# Altium footprint library F10wers_Footprints.PcbLib: 25 footprints (part 1 of 2)
Each footprint in its own frame and in the unit in brackets; x right, y up, seen from the top. Pads: shape width x height; smd on the part's side, far side on the other; paste and mask are expansions set on the pad; w line width, h text height; cw(c..) or ccw(c..) is an arc to the next point about the centre after c.
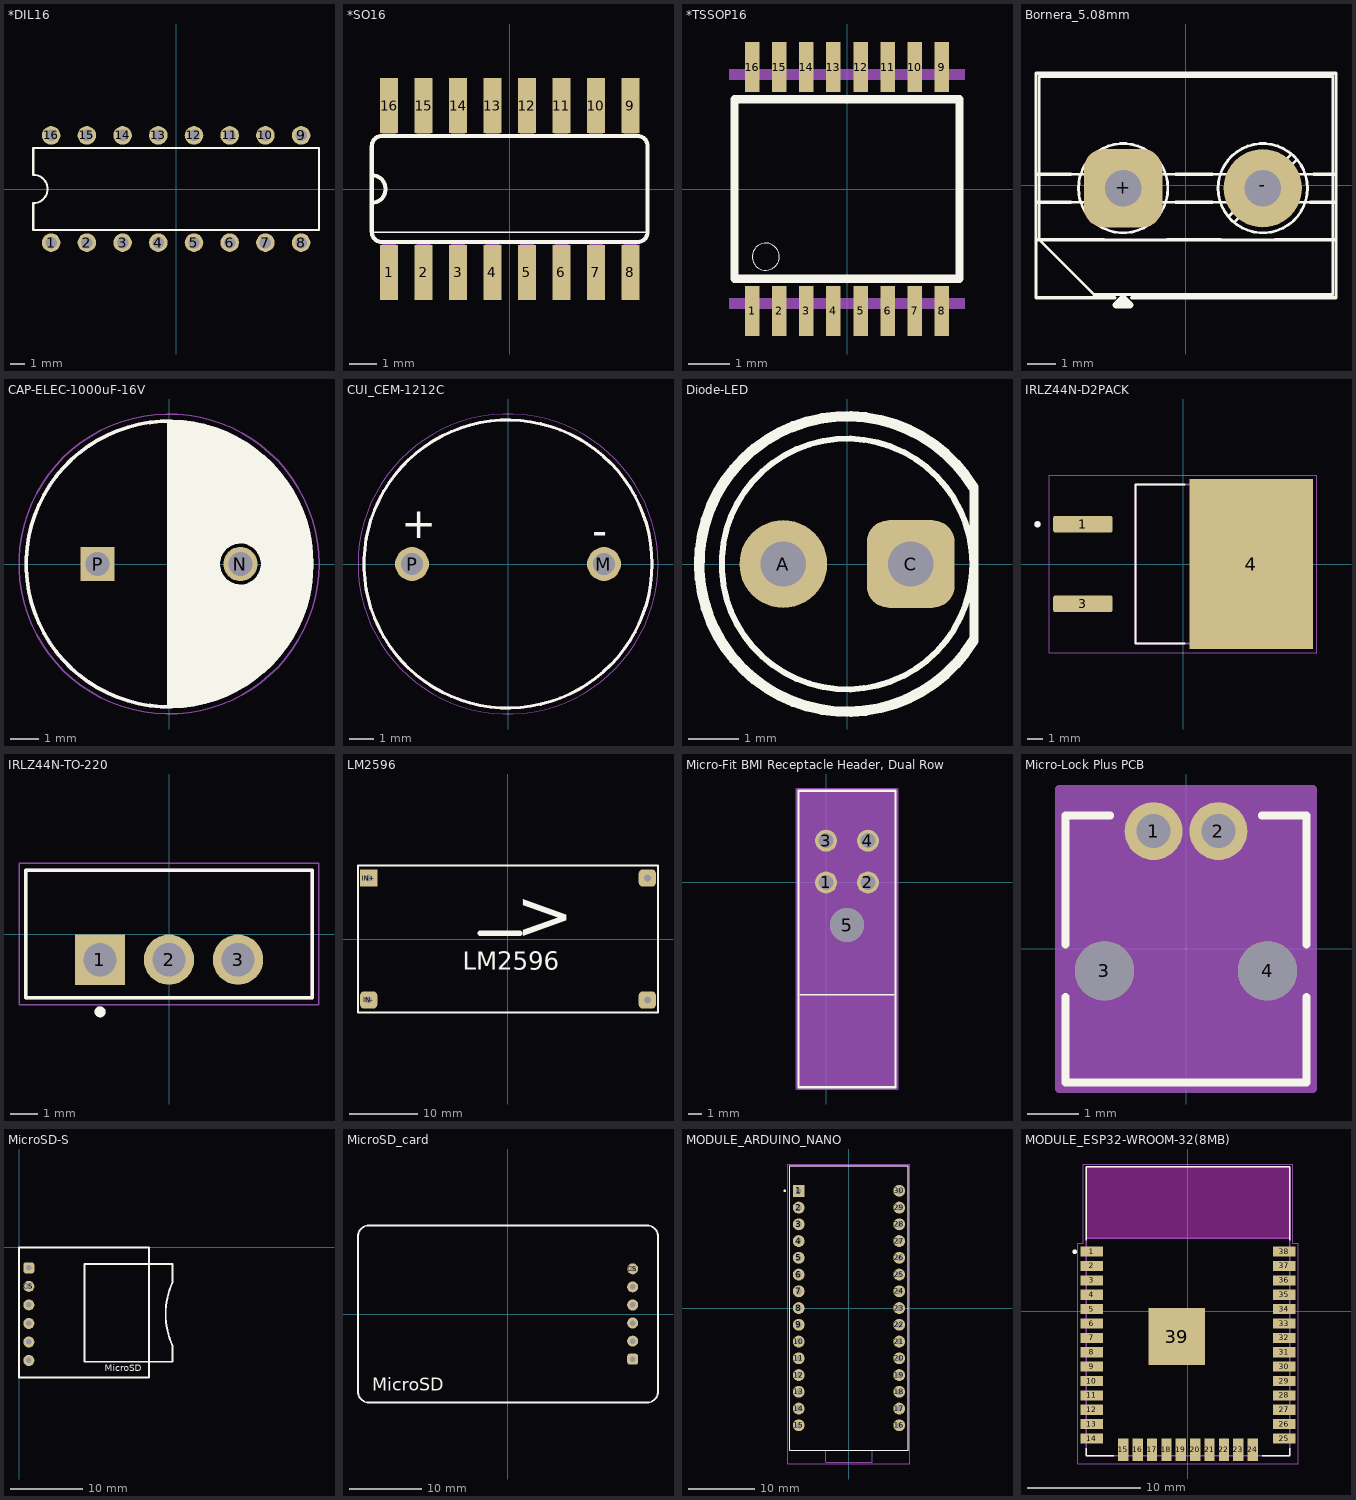
[diagram p0: the footprints below, top view; thin cyan lines are the x and y axes]

## *DIL16 [mil]
pads (16):
  round 52 hole 32: 1(-350,-150) 2(-250,-150) 3(-150,-150) 4(-50,-150) 5(50,-150) 6(150,-150) 7(250,-150) 8(350,-150) 9(350,150) 10(250,150) 11(150,150) 12(50,150) 13(-50,150) 14(-150,150) 15(-250,150) 16(-350,150)
Top Overlay:
  lines w6: -400,-115 -400,-40 ccw(c-400,0) -400,40 -400,115 400,115 400,-115 -400,-115
3D body "ULN2003A--3DModel-STEP-269445.STEP": height 209.84, standoff -154.76, extent -377.56,-164.76 377.56,154.92

## *SO16 [mil]
pads (16):
  rect 26x80 smd: 1(-175,-121) 2(-125,-121) 3(-75,-121) 4(-25,-121) 5(25,-121) 6(75,-121) 7(125,-121) 8(175,-121) 9(175,121) 10(125,121) 11(75,121) 12(25,121) 13(-25,121) 14(-75,121) 15(-125,121) 16(-175,121)
Top Overlay:
  lines w2: -200,-63 200,-63
  lines w6: -200,-20 ccw(c-200,0) -200,20 ; -200,-20 -200,-62 ccw(c-185,-62) -185,-77 185,-77 ccw(c185,-62) 200,-62 200,62 ccw(c185,62) 185,77 -185,77 ccw(c-185,62) -200,62 -200,20 ; -200,-20 -200,20
Mechanical 4:
  region: 165,122 185,122 185,77 165,77
  region: 115,122 135,122 135,77 115,77
  region: 65,122 85,122 85,77 65,77
  region: 15,122 35,122 35,77 15,77
  region: 165,-77 185,-77 185,-122 165,-122
  region: 115,-77 135,-77 135,-122 115,-122
  region: 65,-77 85,-77 85,-122 65,-122
  region: 15,-77 35,-77 35,-122 15,-122
  region: -185,122 -165,122 -165,77 -185,77
  region: -135,122 -115,122 -115,77 -135,77
  region: -85,122 -65,122 -65,77 -85,77
  region: -35,-77 -15,-77 -15,-122 -35,-122
  region: -85,-76 -65,-76 -65,-121 -85,-121
  region: -135,-77 -115,-77 -115,-122 -135,-122
  region: -185,-77 -165,-77 -165,-122 -185,-122
  region: -35,122 -15,122 -15,77 -35,77
  region: 165,122 185,122 185,77 165,77
  region: 115,122 135,122 135,77 115,77
  region: 65,122 85,122 85,77 65,77
  region: 15,122 35,122 35,77 15,77
  region: 165,-77 185,-77 185,-122 165,-122
  region: 115,-77 135,-77 135,-122 115,-122
  region: 65,-77 85,-77 85,-122 65,-122
  region: 15,-77 35,-77 35,-122 15,-122
  region: -185,122 -165,122 -165,77 -185,77
  region: -135,122 -115,122 -115,77 -135,77
  region: -85,122 -65,122 -65,77 -85,77
  region: -35,-77 -15,-77 -15,-122 -35,-122
  region: -85,-76 -65,-76 -65,-121 -85,-121
  region: -135,-77 -115,-77 -115,-122 -135,-122
  region: -185,-77 -165,-77 -165,-122 -185,-122
  region: -35,122 -15,122 -15,77 -35,77

## *TSSOP16 [mm]
pads (16):
  rect 0.35x1.2 smd: 1(-2.275,-2.925) 2(-1.625,-2.925) 3(-0.975,-2.925) 4(-0.325,-2.925) 5(0.325,-2.925) 6(0.975,-2.925) 7(1.625,-2.925) 8(2.275,-2.925) 9(2.275,2.925) 10(1.625,2.925) 11(0.975,2.925) 12(0.325,2.925) 13(-0.325,2.925) 14(-0.975,2.925) 15(-1.625,2.925) 16(-2.275,2.925)
Top Overlay:
  circle w0: c-1.95,-1.625 r0.325
  lines w0.203: -2.7,-2.15 -2.7,2.15 2.7,2.15 2.7,-2.15 -2.7,-2.15
Top Solder:
  region: -2.5,-2.25 -2.05,-2.25 -2.05,-3.6 -2.5,-3.6
  region: -1.85,-2.25 -1.4,-2.25 -1.4,-3.6 -1.85,-3.6
  region: -1.2,-2.25 -0.75,-2.25 -0.75,-3.6 -1.2,-3.6
  region: -0.55,-2.25 -0.1,-2.25 -0.1,-3.6 -0.55,-3.6
  region: 0.1,-2.25 0.55,-2.25 0.55,-3.6 0.1,-3.6
  region: 0.75,-2.25 1.2,-2.25 1.2,-3.6 0.75,-3.6
  region: 1.4,-2.25 1.85,-2.25 1.85,-3.6 1.4,-3.6
  region: 2.05,-2.25 2.5,-2.25 2.5,-3.6 2.05,-3.6
  region: 2.05,3.6 2.5,3.6 2.5,2.25 2.05,2.25
  region: 1.4,3.6 1.85,3.6 1.85,2.25 1.4,2.25
  region: 0.75,3.6 1.2,3.6 1.2,2.25 0.75,2.25
  region: 0.1,3.6 0.55,3.6 0.55,2.25 0.1,2.25
  region: -0.55,3.6 -0.1,3.6 -0.1,2.25 -0.55,2.25
  region: -1.2,3.6 -0.75,3.6 -0.75,2.25 -1.2,2.25
  region: -1.85,3.6 -1.4,3.6 -1.4,2.25 -1.85,2.25
  region: -2.5,3.6 -2.05,3.6 -2.05,2.25 -2.5,2.25
Mechanical 4:
  region: -2.825,-2.625 -1.725,-2.625 -1.725,-2.875 -2.825,-2.875
  region: -2.175,-2.625 -1.075,-2.625 -1.075,-2.875 -2.175,-2.875
  region: -1.525,-2.625 -0.425,-2.625 -0.425,-2.875 -1.525,-2.875
  region: -0.875,-2.625 0.225,-2.625 0.225,-2.875 -0.875,-2.875
  region: -0.225,-2.625 0.875,-2.625 0.875,-2.875 -0.225,-2.875
  region: 0.425,-2.625 1.525,-2.625 1.525,-2.875 0.425,-2.875
  region: 1.075,-2.625 2.175,-2.625 2.175,-2.875 1.075,-2.875
  region: 1.725,-2.625 2.825,-2.625 2.825,-2.875 1.725,-2.875
  region: 1.725,2.875 2.825,2.875 2.825,2.625 1.725,2.625
  region: 1.075,2.875 2.175,2.875 2.175,2.625 1.075,2.625
  region: 0.425,2.875 1.525,2.875 1.525,2.625 0.425,2.625
  region: -0.225,2.875 0.875,2.875 0.875,2.625 -0.225,2.625
  region: -0.875,2.875 0.225,2.875 0.225,2.625 -0.875,2.625
  region: -1.525,2.875 -0.425,2.875 -0.425,2.625 -1.525,2.625
  region: -2.175,2.875 -1.075,2.875 -1.075,2.625 -2.175,2.625
  region: -2.825,2.875 -1.725,2.875 -1.725,2.625 -2.825,2.625
  region: -2.825,-2.625 -1.725,-2.625 -1.725,-2.875 -2.825,-2.875
  region: -2.175,-2.625 -1.075,-2.625 -1.075,-2.875 -2.175,-2.875
  region: -1.525,-2.625 -0.425,-2.625 -0.425,-2.875 -1.525,-2.875
  region: -0.875,-2.625 0.225,-2.625 0.225,-2.875 -0.875,-2.875
  region: -0.225,-2.625 0.875,-2.625 0.875,-2.875 -0.225,-2.875
  region: 0.425,-2.625 1.525,-2.625 1.525,-2.875 0.425,-2.875
  region: 1.075,-2.625 2.175,-2.625 2.175,-2.875 1.075,-2.875
  region: 1.725,-2.625 2.825,-2.625 2.825,-2.875 1.725,-2.875
  region: 1.725,2.875 2.825,2.875 2.825,2.625 1.725,2.625
  region: 1.075,2.875 2.175,2.875 2.175,2.625 1.075,2.625
  region: 0.425,2.875 1.525,2.875 1.525,2.625 0.425,2.625
  region: -0.225,2.875 0.875,2.875 0.875,2.625 -0.225,2.625
  region: -0.875,2.875 0.225,2.875 0.225,2.625 -0.875,2.625
  region: -1.525,2.875 -0.425,2.875 -0.425,2.625 -1.525,2.625
  region: -2.175,2.875 -1.075,2.875 -1.075,2.625 -2.175,2.625
  region: -2.825,2.875 -1.725,2.875 -1.725,2.625 -2.825,2.625

## Bornera_5.08mm [mm]
pads (2):
  rrect50% 2.8x2.8 hole 1.3: +(-2.246,-0.1)
  round 2.8 hole 1.3: -(2.754,-0.1)
Top Overlay:
  circle w0.1: c-2.246,-0.1 r1.6
  circle w0.1: c2.754,-0.1 r1.6
  lines w0.1: -5.246,0.4 5.254,0.4 ; -5.221,-0.6 5.229,-0.6 ; -3.471,-1.125 -1.228,1.118 -1.228,1.113 ; -3.271,-1.325 -1.033,0.918 ; 1.536,-1.113 3.779,1.13 ; 1.736,-1.313 3.974,0.93 ; 5.229,-1.95 -5.246,-1.95 ; -5.246,-1.95 -3.296,-3.9 5.254,-3.9 5.254,3.9 -5.246,3.9 -5.246,-1.95 ; -5.246,-1.95 -5.246,-1.95
  lines w0.12: -5.366,-1.95 -2.946,-1.95 ; -5.366,-0.6 -4.126,-0.6 ; -5.366,0.4 -4.126,0.4 ; -2.546,-4.02 -5.366,-4.02 -5.366,4.02 5.374,4.02 5.374,-4.02 -1.946,-4.02 ; -0.666,-1.95 1.242,-1.95 ; -0.366,-0.6 0.942,-0.6 ; -0.366,0.4 0.942,0.4 ; 3.194,-1.95 5.374,-1.95 ; 4.454,-0.6 5.374,-0.6 ; 4.566,0.4 5.374,0.4
  lines w0.254: -2.496,-4.275 -2.246,-4.025 -1.996,-4.275 -2.121,-4.275 -2.184,-4.275 -2.215,-4.275 -2.277,-4.275 -2.309,-4.275 -2.371,-4.275 -2.496,-4.275
3D body "2 PIN - DG306-5 - PITCH 5 mm.stp": height 10.01, standoff -3.87, extent -5.325,-3.775 5.275,3.825

## CAP-ELEC-1000uF-16V [mm]
pads (2):
  round 1.2 hole 0.85: N(2.5,0)
  rect 1.2x1.2 hole 0.85: P(-2.5,0)
Top Overlay:
  circle w0.127: c0,0 r5
  circle w0.127: c2.5,0 r0.775
  region: 0,0 0,5 0.6,5 0.75,4.95 1.225,4.9 1.355,4.816 1.625,4.775 1.825,4.675 2.075,4.6 2.305,4.435 2.5,4.375 2.825,4.15 3.025,4.05 3.025,4.025 4.1,2.95 4.15,2.775 4.425,2.45 4.507,2.232 4.625,2 4.625,1.8
  region: 0,0 0,-5 0.025,-4.975 0.825,-4.975 1,-4.9 1.35,-4.825 1.525,-4.75 2.009,-4.612 3.098,-3.954
  region: 2.312,0.9 2.312,0.821 2.241,0.75 2.875,0.725 2.925,1.175
  region: 2.875,0.725 2.925,1.175 3,1.175 3.225,1.4 3.55,1.4 3.95,1.8 4.625,1.8 4.625,1.75 4.8,1.575 4.8,1.225 4.925,1.1 4.925,0.575 5,0.5 5,-0.725 4.875,-0.85 4.875,-1.325 4.725,-1.475 4.725,-1.8 4.525,-2 4.65,-1.725
  region: -0.044,-0.017 2.575,1.025 1.72,0.288 1.8,-0.375 2.125,-0.7 2.8,-0.75 2.62,-3.417
  region: 3.325,0.25 4.65,-1.075 4.65,-1.875 4.45,-2.25 2.68,-2.081
  region: 3.1,-0.575 2.975,-0.575 2.71,-0.84 2.71,-2.084
  region: 2.71,-2.084 2.975,-2.025 4.45,-2.25 4.45,-2.375 4.2,-2.65 4.175,-2.825 3.526,-3.526 3.475,-3.577 3.098,-3.954
  region: 2.71,-2.084 2.62,-2.173 2.62,-3.477 3.098,-3.954 3.175,-3.877 3.175,-2.548
  lines w0.127: 0,-5 0,5
Mechanical 13:
  circle w0.127: c0,0 r5
Mechanical 15:
  circle w0.05: c0,0 r5.25
3D body "step_temp.STEP": height 16, standoff -17, extent -5,-4.999 5,4.999

## CUI_CEM-1212C [mm]
pads (2):
  round 1.408 hole 0.9: M(4,0) P(-4,0)
Top Overlay:
  circle w0.127: c0,0 r6
  text "-" at 3.5,0.75 h1.27
  text "+" at -4.45,1.075 h1.27
Mechanical 13:
  circle w0.127: c0,0 r6
Mechanical 15:
  circle w0.05: c0,0 r6.25
3D body "step_temp.STEP": height 9.5, standoff -4.5, extent -6,-6 6,6

## Diode-LED [mm]
pads (2):
  round 1.75 hole 0.9: A(-1.27,0)
  rrect50% 1.75x1.75 hole 0.9: C(1.27,0)
Top Overlay:
  circle w0.12: c0,0 r2.5
  lines w0.12: 2.483,-1.498 cw(c0,0) 2.5,1.47 ; 2.5,-1.47 2.5,1.47 ; 2.56,-1.545 cw(c0,0) 2.56,1.545 2.56,-1.545
3D body "LED 5mm blue.step": height 8.7, standoff -25, extent -2.888,-2.898 2.5,2.898

## IRLZ44N-D2PACK [mm]
pads (3):
  rrect25% 3.78x1.06 smd: 1(-6.4,2.54) 3(-6.4,-2.54)
  rect 7.88x10.84 smd paste-6: 4(4.35,0)
Top Overlay:
  circle w0.2: c-9.29,2.54 r0.1
  lines w0.127: 0.09,-5.08 -3.043,-5.08 -3.043,5.08 0.09,5.08
Top Paste:
  region: 7.74,3.9 6.22,3.9 6.22,5.15 7.74,5.15
  region: 5.11,3.9 3.59,3.9 3.59,5.15 5.11,5.15
  region: 2.48,3.9 0.96,3.9 0.96,5.15 2.48,5.15
  region: 7.74,2.09 6.22,2.09 6.22,3.34 7.74,3.34
  region: 5.11,2.09 3.59,2.09 3.59,3.34 5.11,3.34
  region: 2.48,2.09 0.96,2.09 0.96,3.34 2.48,3.34
  region: 7.74,-5.15 6.22,-5.15 6.22,-3.9 7.74,-3.9
  region: 5.11,-5.15 3.59,-5.15 3.59,-3.9 5.11,-3.9
  region: 2.48,-5.15 0.96,-5.15 0.96,-3.9 2.48,-3.9
  region: 7.74,-3.34 6.22,-3.34 6.22,-2.09 7.74,-2.09
  region: 5.11,-3.34 3.59,-3.34 3.59,-2.09 5.11,-2.09
  region: 2.48,-3.34 0.96,-3.34 0.96,-2.09 2.48,-2.09
  region: 7.74,-1.53 6.22,-1.53 6.22,-0.28 7.74,-0.28
  region: 5.11,-1.53 3.59,-1.53 3.59,-0.28 5.11,-0.28
  region: 2.48,-1.53 0.96,-1.53 0.96,-0.28 2.48,-0.28
  region: 7.74,0.28 6.22,0.28 6.22,1.53 7.74,1.53
  region: 5.11,0.28 3.59,0.28 3.59,1.53 5.11,1.53
  region: 2.48,0.28 0.96,0.28 0.96,1.53 2.48,1.53
Mechanical 13:
  circle w0.2: c-9.29,2.54 r0.1
  lines w0.127: -3.043,-5.08 5.973,-5.08 5.973,5.08 -3.043,5.08 -3.043,-5.08
Mechanical 15:
  lines w0.05: -8.54,-5.67 8.54,-5.67 8.54,5.67 -8.54,5.67 -8.54,-5.67
3D body "step_temp.STEP": height 4.65, standoff -0.15, extent -7.175,-5.08 7.175,5.08

## IRLZ44N-TO-220 [mm]
height 19.3
pads (3):
  rect 1.85x1.85 / inner round 1.85 / far side rect 1.85x1.85 hole 1.23: 1(-2.54,-0.94)
  round 1.85 hole 1.23: 2(0,-0.94) 3(2.54,-0.94)
Top Overlay:
  circle w0.2: c-2.54,-2.86 r0.1
  lines w0.127: -5.27,-2.35 5.27,-2.35 5.27,2.35 -5.27,2.35 -5.27,-2.35
Mechanical 13:
  circle w0.2: c-2.54,-2.86 r0.1
  lines w0.127: -5.27,-2.35 -5.27,2.35 5.27,2.35 5.27,-2.35 -5.27,-2.35
Mechanical 15:
  lines w0.05: -5.52,-2.6 5.52,-2.6 5.52,2.6 -5.52,2.6 -5.52,-2.6
3D body "step_temp.STEP": height 15.01, standoff -10.39, extent -5.08,-1.714 5.08,2.73

## LM2596 [mm]
pads (4):
  rect 2.54x2.54 hole 1: IN+(-20.32,8.89)
  rrect50% 2.54x2.54 hole 1: IN-(-20.32,-8.89) OUT+(20.32,8.89) OUT-(20.32,-8.89)
Top Overlay:
  lines w0.254: -21.875,-10.725 21.875,-10.725 21.875,10.725 -21.875,10.725 -21.875,-10.725
  lines w0.762: -4.075,0.825 1.725,0.825
  text ">" at 1.101,-2.589 h12.7
  text "LM2596" at -6.6,-5.336 h4.44
3D body "YAAJ_DCDC_StepDown_LM2596_PinHeaders_cp.step": height 16.8, standoff -3, extent -21.875,-10.75 21.725,10.55

## Micro-Fit BMI Receptacle Header, Dual Row [mil]
pads (5):
  round 62 / inner round 60 / far side round 62 hole 42 paste-99999 mask+0: 1(0,0) 2(118.11,0) 3(0,118.11) 4(118.11,118.11)
  round 95 / inner round 60 / far side round 95 hole 95 unplated paste-99999 mask+0: 5(59.06,-120.08)
Top Overlay:
  lines w5: -72.94,-317.06 191.06,-317.06
  lines w6: -77.94,-578.06 196.06,-578.06 196.06,258.94 -77.94,258.94 -77.94,-578.06
Mechanical 13:
  circle w20: c0,-75 r15
  lines w1: -72.94,-573.06 191.06,-573.06 191.06,-317.06 191.06,253.94 -72.94,253.94 -72.94,-317.06 -72.94,-573.06
Mechanical 15:
  region: 201.06,263.94 -82.94,263.94 -82.94,-583.06 201.06,-583.06
  lines w6: -82.94,-583.06 201.06,-583.06 201.06,263.94 -82.94,263.94 -82.94,-583.06
3D body "Micro-Fit BMI Receptacle Header, Dual Row.stp": height 413.5, standoff -144.5, extent -72,-571 192,255

## Micro-Lock Plus PCB [mil]
pads (4):
  round 44 hole 26 paste-99999 mask+0: 1(-24.61,89.57) 2(24.61,89.57)
  round 45 hole 45 unplated paste-99999 mask+0: 3(-62.01,-16.73) 4(62.01,-16.73)
Top Overlay:
  lines w6: -91.5,-36.67 -91.5,-101.54 91.5,-101.54 91.5,-36.67 ; -91.5,3.21 -91.5,101.46 -57.63,101.46 ; 57.63,101.46 91.5,101.46 91.5,3.21
Mechanical 13:
  circle w20: c-24.61,89.57 r15
  lines w1: -86.5,-96.54 86.5,-96.54 86.5,96.46 -86.5,96.46 -86.5,-96.54
Mechanical 15:
  region: 96.5,121.57 -96.5,121.57 -96.5,-106.54 96.5,-106.54
  lines w6: -96.5,-106.54 -96.5,121.57 96.5,121.57 96.5,-106.54 -96.5,-106.54
3D body "Micro-Lock Plus PCB.stp": height 152.07, standoff -90.05, extent -86.61,-96.06 86.61,96.46

## MicroSD-S [mil]
pads (6):
  rrect50% 60x60 hole 30: 3V3(53.15,-110.24)
  round 60 hole 30: CLK(53.15,-411.42) CS(53.15,-210.63) GND(53.15,-612.2) MISO(53.15,-511.81) MOSI(53.15,-311.02)
Top Overlay:
  lines w10: 0,-703.94 0,0 703.94,0 703.94,-703.94 0,-703.94 ; 354.72,-619.29 354.72,-89.37 703.94,-89.37 831.5,-89.37 831.5,-190.16 ccw(c1210.46,-360.43) 831.5,-530.71 831.5,-619.29 703.94,-619.29 354.72,-619.29
  text "MicroSD" at 465,-684.3 h60
3D body "microSD_module.step": height 135.52, standoff -8.07, extent 6.73,-709.33 830.07,-0.67

## MicroSD_card [mil]
pads (6):
  round 60 hole 30: CS(679.13,246.06) MISO(679.13,-49.21) MOSI(679.13,49.21) SCK(679.13,147.64) VCC(679.13,-147.64)
  rrect50% 60x60 hole 30: GND(679.13,-246.06)
Top Overlay:
  lines w10: -816.93,-423.23 ccw(c-757.87,-423.23) -757.87,-482.28 757.87,-482.28 ccw(c757.87,-423.23) 816.93,-423.23 816.93,423.23 ccw(c757.87,423.23) 757.87,482.28 -757.87,482.28 ccw(c-757.87,423.23) -816.93,423.23 -816.93,-423.23
  text "MicroSD" at -738.19,-441.53 h118.11
3D body "leitor microsd.step": height 157.98, standoff 0.5, extent -810.04,-472.44 951.71,472.44

## MODULE_ARDUINO_NANO [mm]
pads (30):
  rect 1.8x1.8 / inner round 1.8 / far side rect 1.8x1.8 hole 0.9: 1(-7.62,17.78)
  round 1.8 hole 0.9: 2(-7.62,15.24) 3(-7.62,12.7) 4(-7.62,10.16) 5(-7.62,7.62) 6(-7.62,5.08) 7(-7.62,2.54) 8(-7.62,0) 9(-7.62,-2.54) 10(-7.62,-5.08) 11(-7.62,-7.62) 12(-7.62,-10.16) 13(-7.62,-12.7) 14(-7.62,-15.24) 15(-7.62,-17.78) 16(7.62,-17.78) 17(7.62,-15.24) 18(7.62,-12.7) 19(7.62,-10.16) 20(7.62,-7.62) 21(7.62,-5.08) 22(7.62,-2.54) 23(7.62,0) 24(7.62,2.54) 25(7.62,5.08) 26(7.62,7.62) 27(7.62,10.16) 28(7.62,12.7) 29(7.62,15.24) 30(7.62,17.78)
Top Overlay:
  circle w0.2: c-9.75,17.78 r0.1
  lines w0.127: -9,-21.6 9,-21.6 9,21.6 -9,21.6 -9,-21.6
Mechanical 13:
  circle w0.2: c-9.75,17.78 r0.1
  lines w0.127: -3.5,-21.6 3.5,-21.6 ; -3.5,-21.6 -9,-21.6 -9,21.6 9,21.6 9,-21.6 3.5,-21.6 ; -3.5,-21.6 -3.5,-23.4 3.5,-23.4 3.5,-21.6
Mechanical 15:
  lines w0.05: -9.25,-23.65 -9.25,21.85 9.25,21.85 9.25,-23.65 -9.25,-23.65
3D body "step_temp.STEP": height 12.6, standoff -6, extent -9,-23.4 9,21.6

## MODULE_ESP32-WROOM-32(8MB) [mm]
height 3.2
pads (39):
  rect 2x0.9 smd: 1(-8.5,5.26) 2(-8.5,3.99) 3(-8.5,2.72) 4(-8.5,1.45) 5(-8.5,0.18) 6(-8.5,-1.09) 7(-8.5,-2.36) 8(-8.5,-3.63) 9(-8.5,-4.9) 10(-8.5,-6.17) 11(-8.5,-7.44) 12(-8.5,-8.71) 13(-8.5,-9.98) 14(-8.5,-11.25) 25(8.5,-11.25) 26(8.5,-9.98) 27(8.5,-8.71) 28(8.5,-7.44) 29(8.5,-6.17) 30(8.5,-4.9) 31(8.5,-3.63) 32(8.5,-2.36) 33(8.5,-1.09) 34(8.5,0.18) 35(8.5,1.45) 36(8.5,2.72) 37(8.5,3.99) 38(8.5,5.26)
  rect 0.9x2 smd: 15(-5.715,-12.25) 16(-4.445,-12.25) 17(-3.175,-12.25) 18(-1.905,-12.25) 19(-0.635,-12.25) 20(0.635,-12.25) 21(1.905,-12.25) 22(3.175,-12.25) 23(4.445,-12.25) 24(5.715,-12.25)
  rect 5x5 smd paste-3: 39(-1,-2.24)
Top Overlay:
  circle w0.2: c-10,5.25 r0.1
  lines w0.127: -9,-12.1 -9,-12.75 -6.55,-12.75 ; -9,6.25 -9,12.75 9,12.75 9,6.25 ; 6.55,-12.75 9,-12.75 9,-12.1
Top Paste:
  region: -1.46,-1.78 -3.04,-1.78 -3.04,-0.2 -1.46,-0.2
  region: 1.04,-1.78 -0.54,-1.78 -0.54,-0.2 1.04,-0.2
  region: 1.04,-4.28 -0.54,-4.28 -0.54,-2.7 1.04,-2.7
  region: -1.46,-4.28 -3.04,-4.28 -3.04,-2.7 -1.46,-2.7
Keep-Out Layer:
  region: 9,6.45 -9,6.45 -9,12.75 9,12.75
Mechanical 13:
  circle w0.2: c-10,5.25 r0.1
  lines w0.127: -9,6.45 -9,-12.75 9,-12.75 9,6.45 ; -9,6.45 -9,12.75 9,12.75 9,6.45 ; -9,6.45 9,6.45
  text "ANTENNA" at -6,9 h1.78
Mechanical 15:
  lines w0.05: -9.75,-13.5 9.75,-13.5 9.75,6 9.25,6 9.25,13 -9.25,13 -9.25,6 -9.75,6 -9.75,-13.5
3D body "step_temp.STEP": height 3.2, standoff 0, extent -9,-12.75 9,12.75